# Altium footprint library NXP_60_26022015.PCBLIB: 287 footprints (part 10 of 18)
Each footprint in its own frame and in the unit in brackets; x right, y up, seen from the top. Pads: shape width x height; smd on the part's side, far side on the other; paste and mask are expansions set on the pad; w line width, h text height; cw(c..) or ccw(c..) is an arc to the next point about the centre after c.
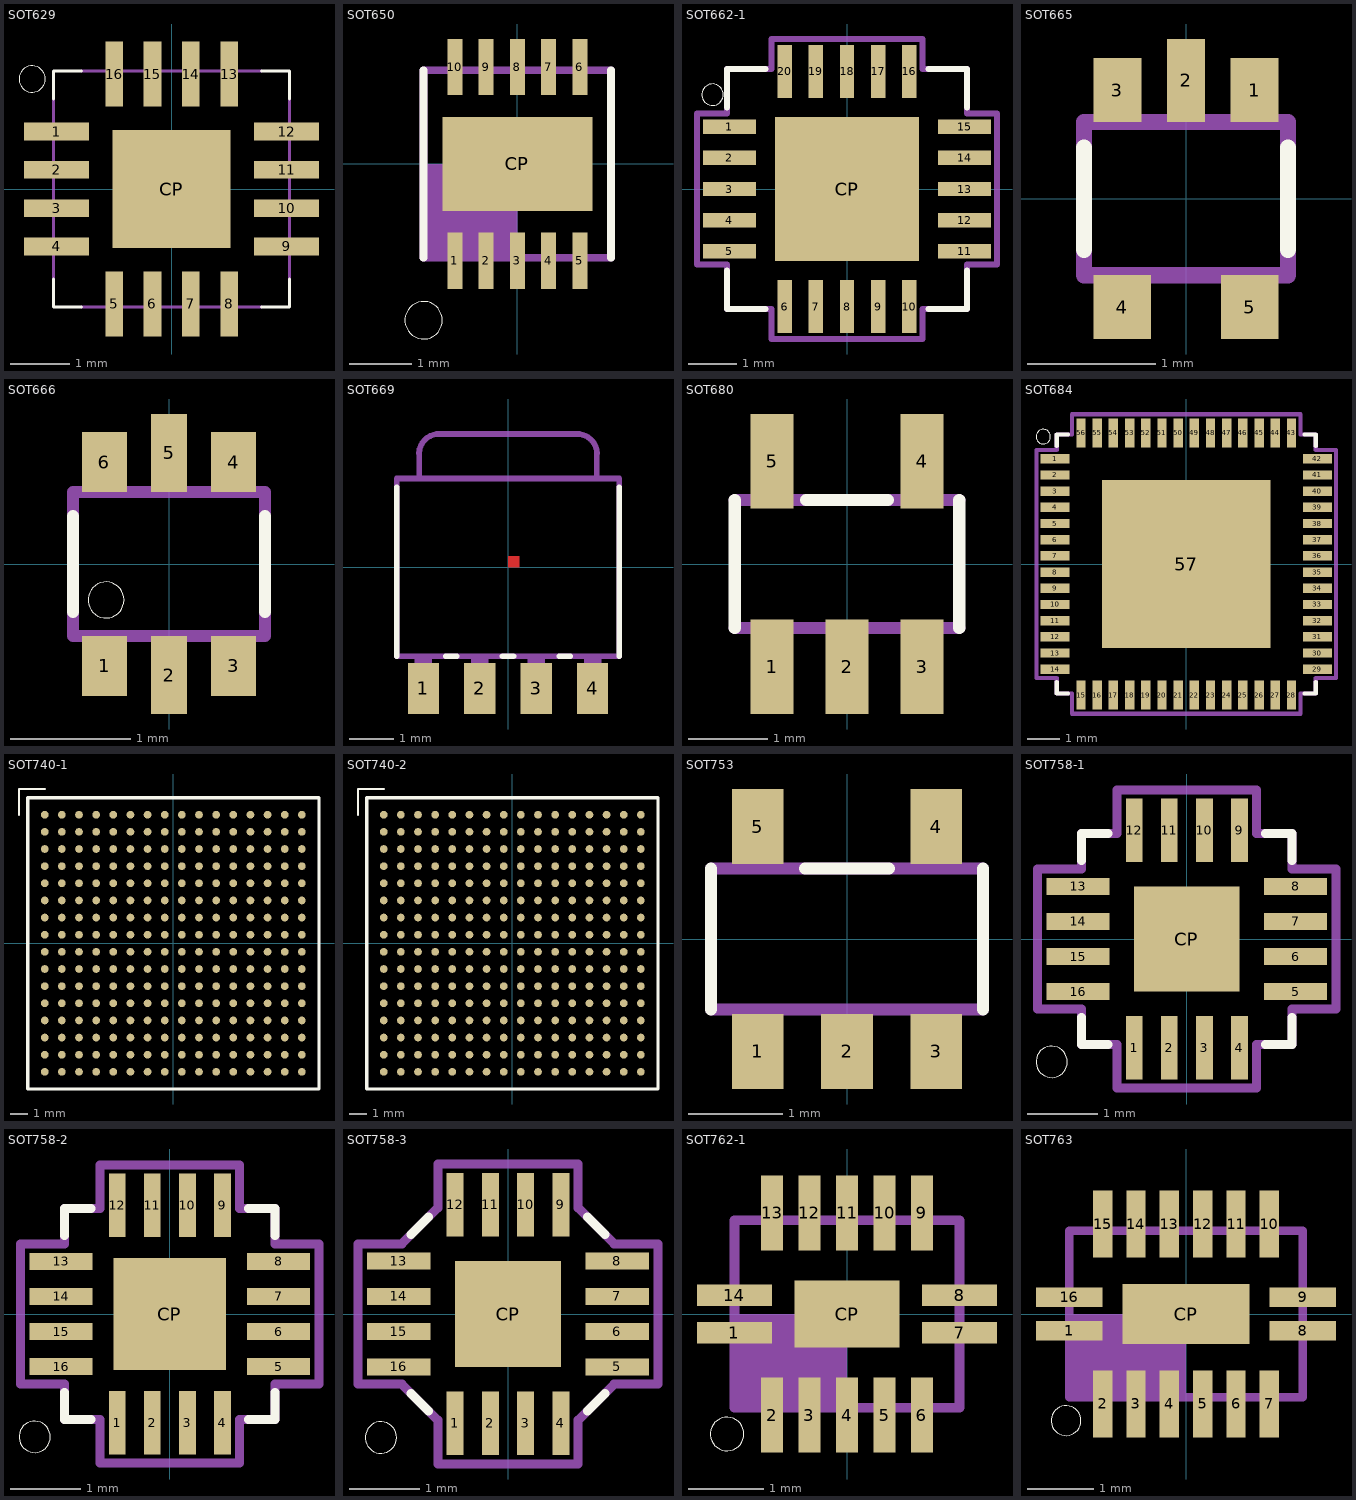
[diagram p9: the footprints below, top view; thin cyan lines are the x and y axes]

## SOT629 [mm]
pads (17):
  rect 1.1x0.3 smd: 1(-1.95,0.975) 2(-1.95,0.325) 3(-1.95,-0.325) 4(-1.95,-0.975) 9(1.95,-0.975) 10(1.95,-0.325) 11(1.95,0.325) 12(1.95,0.975)
  rect 0.3x1.1 smd: 5(-0.975,-1.95) 6(-0.325,-1.95) 7(0.325,-1.95) 8(0.975,-1.95) 13(0.975,1.95) 14(0.325,1.95) 15(-0.325,1.95) 16(-0.975,1.95)
  rect 2x2 smd: CP(0,0)
Top Overlay:
  circle w0: c-2.365,1.865 r0.224
  lines w0.05: -2,-1.525 -2,-2 -1.525,-2 ; -2,1.525 -2,2 -1.525,2 ; 1.525,-2 2,-2 2,-1.525 ; 1.525,2 2,2 2,1.525
Top Paste:
  rectangle: 0.15,0.15 0.6,0.6
  rectangle: -0.6,0.15 -0.15,0.6
  rectangle: 0.15,-0.6 0.6,-0.15
  rectangle: -0.6,-0.6 -0.15,-0.15
Mechanical 16:
  lines w0.05: -2,-1.525 -2,1.525 ; -1.525,-2 1.525,-2 ; -1.525,2 1.525,2 ; 2,-1.525 2,1.525

## SOT650 [mm]
pads (11):
  rect 0.24x0.9 smd: 1(-1,-1.55) 2(-0.5,-1.55) 3(0,-1.55) 4(0.5,-1.55) 5(1,-1.55) 6(1,1.55) 7(0.5,1.55) 8(0,1.55) 9(-0.5,1.55) 10(-1,1.55)
  rect 2.4x1.5 smd: CP(0,0)
Top Overlay:
  circle w0: c-1.5,-2.5 r0.3
  lines w0.127: -1.5,-1.5 -1.5,1.5 ; 1.5,-1.5 1.5,1.5
Top Paste:
  rectangle: 0.15,-0.325 0.7,0.325
  rectangle: -0.7,-0.325 -0.15,0.325
Mechanical 16:
  rectangle: -1.5,-1.5 0,0
  lines w0.127: -1.5,-1.5 1.5,-1.5 1.5,1.5 -1.5,1.5 -1.5,-1.5

## SOT662-1 [mm]
pads (21):
  rect 1.1x0.3 smd: 1(-2.45,1.3) 2(-2.45,0.65) 3(-2.45,0) 4(-2.45,-0.65) 5(-2.45,-1.3) 11(2.45,-1.3) 12(2.45,-0.65) 13(2.45,0) 14(2.45,0.65) 15(2.45,1.3)
  rect 0.3x1.1 smd: 6(-1.3,-2.45) 7(-0.65,-2.45) 8(0,-2.45) 9(0.65,-2.45) 10(1.3,-2.45) 16(1.3,2.45) 17(0.65,2.45) 18(0,2.45) 19(-0.65,2.45) 20(-1.3,2.45)
  rect 3x3 smd: CP(0,0)
Top Overlay:
  circle w0: c-2.8,1.965 r0.224
  lines w0.127: -2.5,-1.7 -2.5,-2.5 -1.7,-2.5 ; -2.5,1.7 -2.5,2.5 -1.7,2.5 ; 1.7,-2.5 2.5,-2.5 2.5,-1.7 ; 1.7,2.5 2.5,2.5 2.5,1.7
Top Paste:
  rectangle: 0.25,0.25 0.9,0.9
  rectangle: -0.9,0.25 -0.25,0.9
  rectangle: 0.25,-0.9 0.9,-0.25
  rectangle: -0.9,-0.9 -0.25,-0.25
Mechanical 16:
  lines w0.127: -3.125,-1.575 -3.125,1.575 -2.5,1.575 -2.5,2.5 -1.575,2.5 -1.575,3.125 1.575,3.125 1.575,2.5 2.5,2.5 2.5,1.575 3.125,1.575 3.125,-1.575 2.5,-1.575 2.5,-2.5 1.575,-2.5 1.575,-3.125 -1.575,-3.125 -1.575,-2.5 -2.5,-2.5 -2.5,-1.575 -3.125,-1.575

## SOT665 [mm]
pads (5):
  rect 0.375x0.5 smd: 1(0.538,0.85) 3(-0.538,0.85)
  rect 0.3x0.65 smd: 2(0,0.925)
  rect 0.45x0.5 smd: 4(-0.5,-0.85) 5(0.5,-0.85)
Top Overlay:
  lines w0.127: -0.8,-0.4 -0.8,0.4 ; 0.8,-0.4 0.8,0.4
Top Paste:
  rectangle: -0.7,-1.075 -0.3,-0.625
  rectangle: 0.3,-1.075 0.7,-0.625
  rectangle: -0.125,0.625 0.125,1.225
  rectangle: -0.701,0.625 -0.375,1.075
  rectangle: 0.375,0.625 0.701,1.075
Mechanical 16:
  rectangle: -0.125,0.6 0.125,0.85
  rectangle: -0.625,-0.85 -0.375,-0.66
  rectangle: 0.375,-0.85 0.625,-0.66
  rectangle: -0.625,0.6 -0.375,0.85
  rectangle: 0.375,0.6 0.625,0.85
  lines w0.127: -0.8,-0.6 0.8,-0.6 0.8,0.6 -0.8,0.6 -0.8,-0.6

## SOT666 [mm]
pads (6):
  rect 0.375x0.5 smd: 1(-0.537,-0.85) 3(0.538,-0.85) 4(0.538,0.85) 6(-0.538,0.85)
  rect 0.3x0.65 smd: 2(0,-0.925) 5(0,0.925)
Top Overlay:
  circle w0: c-0.525,-0.3 r0.15
  lines w0.102: -0.8,-0.4 -0.8,0.4 ; 0.8,-0.4 0.8,0.4
Top Paste:
  rectangle: -0.125,-1.225 0.125,-0.625
  region: 0.125,1.225 -0.125,1.225 -0.125,0.625 0.125,0.625
  rectangle: 0.375,0.625 0.701,1.075
  rectangle: -0.701,0.625 -0.375,1.075
  rectangle: 0.375,-1.075 0.701,-0.625
  rectangle: -0.701,-1.075 -0.375,-0.625
Top Solder:
  region: 0,0 0.254,0 0.254,0.254 0,0.254
  region: 0,0 0.254,0 0.254,0.254 0,0.254
Mechanical 16:
  region: -0.375,-0.85 -0.375,-0.625 -0.625,-0.625 -0.625,-0.85
  region: 0.125,-0.85 0.125,-0.625 -0.125,-0.625 -0.125,-0.85
  region: 0.625,-0.85 0.625,-0.625 0.375,-0.625 0.375,-0.85
  region: 0.375,0.85 0.375,0.625 0.625,0.625 0.625,0.85
  region: -0.125,0.85 -0.125,0.625 0.125,0.625 0.125,0.85
  region: -0.625,0.85 -0.625,0.625 -0.375,0.625 -0.375,0.85
  lines w0.102: -0.8,-0.6 0.8,-0.6 0.8,0.6 -0.8,0.6 -0.8,-0.6

## SOT669 [mm]
pads (5):
  rect 0.7x1.15 smd: 1(-1.905,-2.725) 2(-0.636,-2.725) 3(0.635,-2.725) 4(1.905,-2.725)
  rect 0x0 smd: MB(0,0)
Top Layer:
  region: 0,0 0.254,0 0.254,0.254 0,0.254
Top Overlay:
  lines w0.127: -2.5,-2 -2.5,1.8 ; -1.4,-2 -1.15,-2 ; -0.125,-2 0.125,-2 ; 1.15,-2 1.4,-2 ; 2.5,-2 2.5,1.8
Top Paste:
  rectangle: -0.45,0 0.45,0.6
  rectangle: -0.45,0.85 0.45,1.45
  rectangle: -0.45,-0.85 0.45,-0.25
  rectangle: 0.7,0.85 1.6,1.45
  rectangle: 0.7,0 1.6,0.6
  rectangle: 0.7,-0.85 1.6,-0.25
  rectangle: -1.6,-0.85 -0.7,-0.25
  rectangle: -1.6,0 -0.7,0.6
  rectangle: -1.6,0.85 -0.7,1.45
  rectangle: -2.175,2.55 -1.575,3.45
  rectangle: 1.575,2.55 2.175,3.45
  rectangle: -0.925,2.55 -0.325,3.45
  rectangle: 0.325,2.55 0.925,3.45
Top Solder:
  region: 0,0 0.254,0 0.254,0.254 0,0.254
Mechanical 16:
  rectangle: 0.435,-3 0.835,-2
  rectangle: -0.835,-3 -0.435,-2
  rectangle: -2.105,-3 -1.705,-2
  rectangle: 1.705,-3 2.105,-2
  lines w0.127: -2,2 -2,2.5 cw(c-1.55,2.55) -1.6,3 1.6,3 cw(c1.55,2.55) 2,2.5 2,2 ; 2,2 -2.5,2 -2.5,-2 2.5,-2 2.5,2 2,2

## SOT680 [mm]
pads (5):
  rect 0.55x1.2 smd: 1(-0.95,-1.3) 2(0,-1.3) 3(0.95,-1.3) 4(0.95,1.3) 5(-0.95,1.3)
Top Overlay:
  lines w0.152: -1.422,-0.81 -1.422,0.81 ; -0.522,0.81 0.522,0.81 ; 1.422,-0.81 1.422,0.81
Mechanical 16:
  rectangle: -1.2,-1.5 -0.7,-0.85
  rectangle: -0.25,-1.5 0.25,-0.85
  rectangle: 0.7,-1.5 1.2,-0.85
  rectangle: 0.7,0.85 1.2,1.5
  rectangle: -1.2,0.85 -0.7,1.5
  lines w0.152: -1.422,-0.81 1.422,-0.81 ; -1.422,0.81 1.422,0.81

## SOT684 [mm]
pads (57):
  rect 0.9x0.29 smd: 1(-4.05,3.25) 2(-4.05,2.75) 3(-4.05,2.25) 4(-4.05,1.75) 5(-4.05,1.25) 6(-4.05,0.75) 7(-4.05,0.25) 8(-4.05,-0.25) 9(-4.05,-0.75) 10(-4.05,-1.25) 11(-4.05,-1.75) 12(-4.05,-2.25) 13(-4.05,-2.75) 14(-4.05,-3.25) 29(4.05,-3.25) 30(4.05,-2.75) 31(4.05,-2.25) 32(4.05,-1.75) 33(4.05,-1.25) 34(4.05,-0.75) 35(4.05,-0.25) 36(4.05,0.25) 37(4.05,0.75) 38(4.05,1.25) 39(4.05,1.75) 40(4.05,2.25) 41(4.05,2.75) 42(4.05,3.25)
  rect 0.29x0.9 smd: 15(-3.25,-4.05) 16(-2.75,-4.05) 17(-2.25,-4.05) 18(-1.75,-4.05) 19(-1.25,-4.05) 20(-0.75,-4.05) 21(-0.25,-4.05) 22(0.25,-4.05) 23(0.75,-4.05) 24(1.25,-4.05) 25(1.75,-4.05) 26(2.25,-4.05) 27(2.75,-4.05) 28(3.25,-4.05) 43(3.25,4.05) 44(2.75,4.05) 45(2.25,4.05) 46(1.75,4.05) 47(1.25,4.05) 48(0.75,4.05) 49(0.25,4.05) 50(-0.25,4.05) 51(-0.75,4.05) 52(-1.25,4.05) 53(-1.75,4.05) 54(-2.25,4.05) 55(-2.75,4.05) 56(-3.25,4.05)
  rect 5.2x5.2 smd: 57(0,0)
Top Overlay:
  circle w0: c-4.418,3.935 r0.224
  lines w0.127: -4,-3.65 -4,-4 -3.65,-4 ; -4,3.65 -4,4 -3.65,4 ; 3.65,-4 4,-4 4,-3.65 ; 3.65,4 4,4 4,3.65
Top Paste:
  rectangle: 0.15,0.15 0.75,0.75
  rectangle: -0.75,0.15 -0.15,0.75
  rectangle: 0.15,-0.75 0.75,-0.15
  rectangle: -0.75,-0.75 -0.15,-0.15
  rectangle: 1.05,0.15 1.65,0.75
  rectangle: 1.05,-0.75 1.65,-0.15
  rectangle: -1.65,0.15 -1.05,0.75
  rectangle: 0.15,1.05 0.75,1.65
  rectangle: 1.05,1.05 1.65,1.65
  rectangle: -0.75,1.05 -0.15,1.65
  rectangle: -1.65,1.05 -1.05,1.65
  rectangle: -1.65,-0.75 -1.05,-0.15
  rectangle: -0.75,-1.65 -0.15,-1.05
  rectangle: 0.15,-1.65 0.75,-1.05
  rectangle: 1.05,-1.65 1.65,-1.05
  rectangle: -1.65,-1.65 -1.05,-1.05
Mechanical 16:
  lines w0.127: -4.625,-3.525 -4.625,3.525 -4,3.525 -4,4 -3.525,4 -3.525,4.625 3.525,4.625 3.525,4 4,4 4,3.525 4.625,3.525 4.625,-3.525 4,-3.525 4,-4 3.525,-4 3.525,-4.625 -3.525,-4.625 -3.525,-4 -4,-4 -4,-3.525 -4.625,-3.525

## SOT740-1 [mm]
pads (256):
  rrect100% 0.45x0.45 smd: A1(-7.5,7.5) A2(-6.5,7.5) A3(-5.5,7.5) A4(-4.5,7.5) A5(-3.5,7.5) A6(-2.5,7.5) A7(-1.5,7.5) A8(-0.5,7.5) A9(0.5,7.5) A10(1.5,7.5) A11(2.5,7.5) A12(3.5,7.5) A13(4.5,7.5) A14(5.5,7.5) A15(6.5,7.5) A16(7.5,7.5) B1(-7.5,6.5) B2(-6.5,6.5) B3(-5.5,6.5) B4(-4.5,6.5) B5(-3.5,6.5) B6(-2.5,6.5) B7(-1.5,6.5) B8(-0.5,6.5) B9(0.5,6.5) B10(1.5,6.5) B11(2.5,6.5) B12(3.5,6.5) B13(4.5,6.5) B14(5.5,6.5) B15(6.5,6.5) B16(7.5,6.5) C1(-7.5,5.5) C2(-6.5,5.5) C3(-5.5,5.5) C4(-4.5,5.5) C5(-3.5,5.5) C6(-2.5,5.5) C7(-1.5,5.5) C8(-0.5,5.5) C9(0.5,5.5) C10(1.5,5.5) C11(2.5,5.5) C12(3.5,5.5) C13(4.5,5.5) C14(5.5,5.5) C15(6.5,5.5) C16(7.5,5.5) D1(-7.5,4.5) D2(-6.5,4.5) D3(-5.5,4.5) D4(-4.5,4.5) D5(-3.5,4.5) D6(-2.5,4.5) D7(-1.5,4.5) D8(-0.5,4.5) D9(0.5,4.5) D10(1.5,4.5) D11(2.5,4.5) D12(3.5,4.5) D13(4.5,4.5) D14(5.5,4.5) D15(6.5,4.5) D16(7.5,4.5) E1(-7.5,3.5) E2(-6.5,3.5) E3(-5.5,3.5) E4(-4.5,3.5) E5(-3.5,3.5) E6(-2.5,3.5) E7(-1.5,3.5) E8(-0.5,3.5) E9(0.5,3.5) E10(1.5,3.5) E11(2.5,3.5) E12(3.5,3.5) E13(4.5,3.5) E14(5.5,3.5) E15(6.5,3.5) E16(7.5,3.5) F1(-7.5,2.5) F2(-6.5,2.5) F3(-5.5,2.5) F4(-4.5,2.5) F5(-3.5,2.5) F6(-2.5,2.5) F7(-1.5,2.5) F8(-0.5,2.5) F9(0.5,2.5) F10(1.5,2.5) F11(2.5,2.5) F12(3.5,2.5) F13(4.5,2.5) F14(5.5,2.5) F15(6.5,2.5) F16(7.5,2.5) G1(-7.5,1.5) G2(-6.5,1.5) G3(-5.5,1.5) G4(-4.5,1.5) G5(-3.5,1.5) G6(-2.5,1.5) G7(-1.5,1.5) G8(-0.5,1.5) G9(0.5,1.5) G10(1.5,1.5) G11(2.5,1.5) G12(3.5,1.5) G13(4.5,1.5) G14(5.5,1.5) G15(6.5,1.5) G16(7.5,1.5) H1(-7.5,0.5) H2(-6.5,0.5) H3(-5.5,0.5) H4(-4.5,0.5) H5(-3.5,0.5) H6(-2.5,0.5) H7(-1.5,0.5) H8(-0.5,0.5) H9(0.5,0.5) H10(1.5,0.5) H11(2.5,0.5) H12(3.5,0.5) H13(4.5,0.5) H14(5.5,0.5) H15(6.5,0.5) H16(7.5,0.5) J1(-7.5,-0.5) J2(-6.5,-0.5) J3(-5.5,-0.5) J4(-4.5,-0.5) J5(-3.5,-0.5) J6(-2.5,-0.5) J7(-1.5,-0.5) J8(-0.5,-0.5) J9(0.5,-0.5) J10(1.5,-0.5) J11(2.5,-0.5) J12(3.5,-0.5) J13(4.5,-0.5) J14(5.5,-0.5) J15(6.5,-0.5) J16(7.5,-0.5) K1(-7.5,-1.5) K2(-6.5,-1.5) K3(-5.5,-1.5) K4(-4.5,-1.5) K5(-3.5,-1.5) K6(-2.5,-1.5) K7(-1.5,-1.5) K8(-0.5,-1.5) K9(0.5,-1.5) K10(1.5,-1.5) K11(2.5,-1.5) K12(3.5,-1.5) K13(4.5,-1.5) K14(5.5,-1.5) K15(6.5,-1.5) K16(7.5,-1.5) L1(-7.5,-2.5) L2(-6.5,-2.5) L3(-5.5,-2.5) L4(-4.5,-2.5) L5(-3.5,-2.5) L6(-2.5,-2.5) L7(-1.5,-2.5) L8(-0.5,-2.5) L9(0.5,-2.5) L10(1.5,-2.5) L11(2.5,-2.5) L12(3.5,-2.5) L13(4.5,-2.5) L14(5.5,-2.5) L15(6.5,-2.5) L16(7.5,-2.5) M1(-7.5,-3.5) M2(-6.5,-3.5) M3(-5.5,-3.5) M4(-4.5,-3.5) M5(-3.5,-3.5) M6(-2.5,-3.5) M7(-1.5,-3.5) M8(-0.5,-3.5) M9(0.5,-3.5) M10(1.5,-3.5) M11(2.5,-3.5) M12(3.5,-3.5) M13(4.5,-3.5) M14(5.5,-3.5) M15(6.5,-3.5) M16(7.5,-3.5) N1(-7.5,-4.5) N2(-6.5,-4.5) N3(-5.5,-4.5) N4(-4.5,-4.5) N5(-3.5,-4.5) N6(-2.5,-4.5) N7(-1.5,-4.5) N8(-0.5,-4.5) N9(0.5,-4.5) N10(1.5,-4.5) N11(2.5,-4.5) N12(3.5,-4.5) N13(4.5,-4.5) N14(5.5,-4.5) N15(6.5,-4.5) N16(7.5,-4.5) P1(-7.5,-5.5) P2(-6.5,-5.5) P3(-5.5,-5.5) P4(-4.5,-5.5) P5(-3.5,-5.5) P6(-2.5,-5.5) P7(-1.5,-5.5) P8(-0.5,-5.5) P9(0.5,-5.5) P10(1.5,-5.5) P11(2.5,-5.5) P12(3.5,-5.5) P13(4.5,-5.5) P14(5.5,-5.5) P15(6.5,-5.5) P16(7.5,-5.5) R1(-7.5,-6.5) R2(-6.5,-6.5) R3(-5.5,-6.5) R4(-4.5,-6.5) R5(-3.5,-6.5) R6(-2.5,-6.5) R7(-1.5,-6.5) R8(-0.5,-6.5) R9(0.5,-6.5) R10(1.5,-6.5) R11(2.5,-6.5) R12(3.5,-6.5) R13(4.5,-6.5) R14(5.5,-6.5) R15(6.5,-6.5) R16(7.5,-6.5) T1(-7.5,-7.5) T2(-6.5,-7.5) T3(-5.5,-7.5) T4(-4.5,-7.5) T5(-3.5,-7.5) T6(-2.5,-7.5) T7(-1.5,-7.5) T8(-0.5,-7.5) T9(0.5,-7.5) T10(1.5,-7.5) T11(2.5,-7.5) T12(3.5,-7.5) T13(4.5,-7.5) T14(5.5,-7.5) T15(6.5,-7.5) T16(7.5,-7.5)
Top Overlay:
  lines w0.127: -9,7.5 -9,9 -7.5,9
  lines w0.203: -8.5,-8.5 8.5,-8.5 8.5,8.5 -8.5,8.5 -8.5,-8.5

## SOT740-2 [mm]
pads (256):
  rrect100% 0.45x0.45 smd: A1(-7.5,7.5) A2(-6.5,7.5) A3(-5.5,7.5) A4(-4.5,7.5) A5(-3.5,7.5) A6(-2.5,7.5) A7(-1.5,7.5) A8(-0.5,7.5) A9(0.5,7.5) A10(1.5,7.5) A11(2.5,7.5) A12(3.5,7.5) A13(4.5,7.5) A14(5.5,7.5) A15(6.5,7.5) A16(7.5,7.5) B1(-7.5,6.5) B2(-6.5,6.5) B3(-5.5,6.5) B4(-4.5,6.5) B5(-3.5,6.5) B6(-2.5,6.5) B7(-1.5,6.5) B8(-0.5,6.5) B9(0.5,6.5) B10(1.5,6.5) B11(2.5,6.5) B12(3.5,6.5) B13(4.5,6.5) B14(5.5,6.5) B15(6.5,6.5) B16(7.5,6.5) C1(-7.5,5.5) C2(-6.5,5.5) C3(-5.5,5.5) C4(-4.5,5.5) C5(-3.5,5.5) C6(-2.5,5.5) C7(-1.5,5.5) C8(-0.5,5.5) C9(0.5,5.5) C10(1.5,5.5) C11(2.5,5.5) C12(3.5,5.5) C13(4.5,5.5) C14(5.5,5.5) C15(6.5,5.5) C16(7.5,5.5) D1(-7.5,4.5) D2(-6.5,4.5) D3(-5.5,4.5) D4(-4.5,4.5) D5(-3.5,4.5) D6(-2.5,4.5) D7(-1.5,4.5) D8(-0.5,4.5) D9(0.5,4.5) D10(1.5,4.5) D11(2.5,4.5) D12(3.5,4.5) D13(4.5,4.5) D14(5.5,4.5) D15(6.5,4.5) D16(7.5,4.5) E1(-7.5,3.5) E2(-6.5,3.5) E3(-5.5,3.5) E4(-4.5,3.5) E5(-3.5,3.5) E6(-2.5,3.5) E7(-1.5,3.5) E8(-0.5,3.5) E9(0.5,3.5) E10(1.5,3.5) E11(2.5,3.5) E12(3.5,3.5) E13(4.5,3.5) E14(5.5,3.5) E15(6.5,3.5) E16(7.5,3.5) F1(-7.5,2.5) F2(-6.5,2.5) F3(-5.5,2.5) F4(-4.5,2.5) F5(-3.5,2.5) F6(-2.5,2.5) F7(-1.5,2.5) F8(-0.5,2.5) F9(0.5,2.5) F10(1.5,2.5) F11(2.5,2.5) F12(3.5,2.5) F13(4.5,2.5) F14(5.5,2.5) F15(6.5,2.5) F16(7.5,2.5) G1(-7.5,1.5) G2(-6.5,1.5) G3(-5.5,1.5) G4(-4.5,1.5) G5(-3.5,1.5) G6(-2.5,1.5) G7(-1.5,1.5) G8(-0.5,1.5) G9(0.5,1.5) G10(1.5,1.5) G11(2.5,1.5) G12(3.5,1.5) G13(4.5,1.5) G14(5.5,1.5) G15(6.5,1.5) G16(7.5,1.5) H1(-7.5,0.5) H2(-6.5,0.5) H3(-5.5,0.5) H4(-4.5,0.5) H5(-3.5,0.5) H6(-2.5,0.5) H7(-1.5,0.5) H8(-0.5,0.5) H9(0.5,0.5) H10(1.5,0.5) H11(2.5,0.5) H12(3.5,0.5) H13(4.5,0.5) H14(5.5,0.5) H15(6.5,0.5) H16(7.5,0.5) J1(-7.5,-0.5) J2(-6.5,-0.5) J3(-5.5,-0.5) J4(-4.5,-0.5) J5(-3.5,-0.5) J6(-2.5,-0.5) J7(-1.5,-0.5) J8(-0.5,-0.5) J9(0.5,-0.5) J10(1.5,-0.5) J11(2.5,-0.5) J12(3.5,-0.5) J13(4.5,-0.5) J14(5.5,-0.5) J15(6.5,-0.5) J16(7.5,-0.5) K1(-7.5,-1.5) K2(-6.5,-1.5) K3(-5.5,-1.5) K4(-4.5,-1.5) K5(-3.5,-1.5) K6(-2.5,-1.5) K7(-1.5,-1.5) K8(-0.5,-1.5) K9(0.5,-1.5) K10(1.5,-1.5) K11(2.5,-1.5) K12(3.5,-1.5) K13(4.5,-1.5) K14(5.5,-1.5) K15(6.5,-1.5) K16(7.5,-1.5) L1(-7.5,-2.5) L2(-6.5,-2.5) L3(-5.5,-2.5) L4(-4.5,-2.5) L5(-3.5,-2.5) L6(-2.5,-2.5) L7(-1.5,-2.5) L8(-0.5,-2.5) L9(0.5,-2.5) L10(1.5,-2.5) L11(2.5,-2.5) L12(3.5,-2.5) L13(4.5,-2.5) L14(5.5,-2.5) L15(6.5,-2.5) L16(7.5,-2.5) M1(-7.5,-3.5) M2(-6.5,-3.5) M3(-5.5,-3.5) M4(-4.5,-3.5) M5(-3.5,-3.5) M6(-2.5,-3.5) M7(-1.5,-3.5) M8(-0.5,-3.5) M9(0.5,-3.5) M10(1.5,-3.5) M11(2.5,-3.5) M12(3.5,-3.5) M13(4.5,-3.5) M14(5.5,-3.5) M15(6.5,-3.5) M16(7.5,-3.5) N1(-7.5,-4.5) N2(-6.5,-4.5) N3(-5.5,-4.5) N4(-4.5,-4.5) N5(-3.5,-4.5) N6(-2.5,-4.5) N7(-1.5,-4.5) N8(-0.5,-4.5) N9(0.5,-4.5) N10(1.5,-4.5) N11(2.5,-4.5) N12(3.5,-4.5) N13(4.5,-4.5) N14(5.5,-4.5) N15(6.5,-4.5) N16(7.5,-4.5) P1(-7.5,-5.5) P2(-6.5,-5.5) P3(-5.5,-5.5) P4(-4.5,-5.5) P5(-3.5,-5.5) P6(-2.5,-5.5) P7(-1.5,-5.5) P8(-0.5,-5.5) P9(0.5,-5.5) P10(1.5,-5.5) P11(2.5,-5.5) P12(3.5,-5.5) P13(4.5,-5.5) P14(5.5,-5.5) P15(6.5,-5.5) P16(7.5,-5.5) R1(-7.5,-6.5) R2(-6.5,-6.5) R3(-5.5,-6.5) R4(-4.5,-6.5) R5(-3.5,-6.5) R6(-2.5,-6.5) R7(-1.5,-6.5) R8(-0.5,-6.5) R9(0.5,-6.5) R10(1.5,-6.5) R11(2.5,-6.5) R12(3.5,-6.5) R13(4.5,-6.5) R14(5.5,-6.5) R15(6.5,-6.5) R16(7.5,-6.5) T1(-7.5,-7.5) T2(-6.5,-7.5) T3(-5.5,-7.5) T4(-4.5,-7.5) T5(-3.5,-7.5) T6(-2.5,-7.5) T7(-1.5,-7.5) T8(-0.5,-7.5) T9(0.5,-7.5) T10(1.5,-7.5) T11(2.5,-7.5) T12(3.5,-7.5) T13(4.5,-7.5) T14(5.5,-7.5) T15(6.5,-7.5) T16(7.5,-7.5)
Top Overlay:
  lines w0.127: -9,7.5 -9,9 -7.5,9
  lines w0.203: -8.5,-8.5 8.5,-8.5 8.5,8.5 -8.5,8.5 -8.5,-8.5

## SOT753 [mil]
pads (5):
  rect 21.65x31.5 smd: 1(-37.4,-47.24) 2(0,-47.24) 3(37.4,-47.24) 4(37.4,47.24) 5(-37.4,47.24)
Top Overlay:
  lines w5: -57.09,-29.53 -57.09,29.53 ; -17.72,29.53 17.72,29.53 ; 57.09,-29.53 57.09,29.53
Mechanical 16:
  rectangle: -43.7,29.53 -30.71,56.3
  rectangle: 31.1,29.53 44.09,55.91
  rectangle: -43.7,-55.91 -30.71,-29.53
  rectangle: -6.3,-55.91 6.69,-29.53
  rectangle: 31.1,-55.91 44.09,-29.53
  lines w5: -57.09,-29.53 57.09,-29.53 ; -57.09,29.53 57.09,29.53

## SOT758-1 [mm]
pads (17):
  rect 0.24x0.9 smd: 1(-0.75,-1.55) 2(-0.25,-1.55) 3(0.25,-1.55) 4(0.75,-1.55) 9(0.75,1.55) 10(0.25,1.55) 11(-0.25,1.55) 12(-0.75,1.55)
  rect 0.9x0.24 smd: 5(1.55,-0.75) 6(1.55,-0.25) 7(1.55,0.25) 8(1.55,0.75) 13(-1.55,0.75) 14(-1.55,0.25) 15(-1.55,-0.25) 16(-1.55,-0.75)
  rect 1.5x1.5 smd: CP(0,0)
Top Overlay:
  circle w0: c-1.925,-1.75 r0.224
  lines w0.127: -1.5,-1.12 -1.5,-1.5 -1.12,-1.5 ; -1.5,1.12 -1.5,1.5 -1.12,1.5 ; 1.12,-1.5 1.5,-1.5 1.5,-1.12 ; 1.12,1.5 1.5,1.5 1.5,1.12
Top Paste:
  rectangle: -0.325,-0.325 0.325,0.325
Mechanical 16:
  lines w0.127: -2.125,-0.995 -2.125,0.995 -1.5,0.995 -1.5,1.5 -0.995,1.5 -0.995,2.125 0.995,2.125 0.995,1.5 1.5,1.5 1.5,0.995 2.125,0.995 2.125,-0.995 1.5,-0.995 1.5,-1.5 0.995,-1.5 0.995,-2.125 -0.995,-2.125 -0.995,-1.5 -1.5,-1.5 -1.5,-0.995 -2.125,-0.995

## SOT758-2 [mm]
pads (17):
  rect 0.24x0.9 smd: 1(-0.75,-1.55) 2(-0.25,-1.55) 3(0.25,-1.55) 4(0.75,-1.55) 9(0.75,1.55) 10(0.25,1.55) 11(-0.25,1.55) 12(-0.75,1.55)
  rect 0.9x0.24 smd: 5(1.55,-0.75) 6(1.55,-0.25) 7(1.55,0.25) 8(1.55,0.75) 13(-1.55,0.75) 14(-1.55,0.25) 15(-1.55,-0.25) 16(-1.55,-0.75)
  rect 1.6x1.6 smd: CP(0,0)
Top Overlay:
  circle w0: c-1.925,-1.75 r0.224
  lines w0.127: -1.5,-1.12 -1.5,-1.5 -1.12,-1.5 ; -1.5,1.12 -1.5,1.5 -1.12,1.5 ; 1.12,-1.5 1.5,-1.5 1.5,-1.12 ; 1.12,1.5 1.5,1.5 1.5,1.12
Top Paste:
  rectangle: -0.325,-0.325 0.325,0.325
Mechanical 16:
  lines w0.127: -2.125,-0.995 -2.125,0.995 -1.5,0.995 -1.5,1.5 -0.995,1.5 -0.995,2.125 0.995,2.125 0.995,1.5 1.5,1.5 1.5,0.995 2.125,0.995 2.125,-0.995 1.5,-0.995 1.5,-1.5 0.995,-1.5 0.995,-2.125 -0.995,-2.125 -0.995,-1.5 -1.5,-1.5 -1.5,-0.995 -2.125,-0.995

## SOT758-3 [mm]
pads (17):
  rect 0.24x0.9 smd: 1(-0.75,-1.55) 2(-0.25,-1.55) 3(0.25,-1.55) 4(0.75,-1.55) 9(0.75,1.55) 10(0.25,1.55) 11(-0.25,1.55) 12(-0.75,1.55)
  rect 0.9x0.24 smd: 5(1.55,-0.75) 6(1.55,-0.25) 7(1.55,0.25) 8(1.55,0.75) 13(-1.55,0.75) 14(-1.55,0.25) 15(-1.55,-0.25) 16(-1.55,-0.75)
  rect 1.5x1.5 smd: CP(0,0)
Top Overlay:
  circle w0: c-1.8,-1.75 r0.224
  lines w0.127: -1.375,-1.125 -1.125,-1.375 ; -1.375,1.125 -1.125,1.375 ; 1.125,-1.375 1.375,-1.125 ; 1.125,1.375 1.375,1.125
Top Paste:
  rectangle: -0.35,-0.35 0.35,0.35
Mechanical 16:
  lines w0.127: -2.125,-0.995 -2.125,0.995 -1.5,0.995 -1.5,1 -1,1.5 -0.995,1.5 -0.995,2.125 0.995,2.125 0.995,1.5 1,1.5 1.5,1 1.5,0.995 2.125,0.995 2.125,-0.995 1.5,-0.995 1.5,-1 1,-1.5 0.995,-1.5 0.995,-2.125 -0.995,-2.125 -0.995,-1.5 -1,-1.5 -1.5,-1 -1.5,-0.995 -2.125,-0.995

## SOT762-1 [mm]
pads (15):
  rect 1x0.29 smd: 1(-1.5,-0.25) 7(1.5,-0.25) 8(1.5,0.25) 14(-1.5,0.25)
  rect 0.29x1 smd: 2(-1,-1.35) 3(-0.5,-1.35) 4(0,-1.35) 5(0.5,-1.35) 6(1,-1.35) 9(1,1.35) 10(0.5,1.35) 11(0,1.35) 12(-0.5,1.35) 13(-1,1.35)
  rect 1.4x0.9 smd: CP(0,0)
Top Overlay:
  circle w0: c-1.6,-1.6 r0.224
Top Paste:
  rectangle: -0.3,-0.2 0.3,0.2
Mechanical 16:
  rectangle: -1.5,-1.25 0,0
  lines w0.127: -1.5,-1.25 1.5,-1.25 1.5,1.25 -1.5,1.25 -1.5,-1.25

## SOT763 [mm]
pads (17):
  rect 1x0.29 smd: 1(-1.75,-0.25) 8(1.75,-0.25) 9(1.75,0.25) 16(-1.75,0.25)
  rect 0.29x1 smd: 2(-1.25,-1.35) 3(-0.75,-1.35) 4(-0.25,-1.35) 5(0.25,-1.35) 6(0.75,-1.35) 7(1.25,-1.35) 10(1.25,1.35) 11(0.75,1.35) 12(0.25,1.35) 13(-0.25,1.35) 14(-0.75,1.35) 15(-1.25,1.35)
  rect 1.9x0.9 smd: CP(0,0)
Top Overlay:
  circle w0: c-1.8,-1.6 r0.224
Top Paste:
  rectangle: -0.55,-0.2 -0.15,0.2
  rectangle: 0.15,-0.2 0.55,0.2
Mechanical 16:
  rectangle: -1.75,-1.25 0,0
  lines w0.127: -1.75,-1.25 1.75,-1.25 1.75,1.25 -1.75,1.25 -1.75,-1.25